# Altium footprint library misc.PcbLib: 60 footprints (part 3 of 4)
Each footprint in its own frame and in the unit in brackets; x right, y up, seen from the top. Pads: shape width x height; smd on the part's side, far side on the other; paste and mask are expansions set on the pad; w line width, h text height; cw(c..) or ccw(c..) is an arc to the next point about the centre after c.
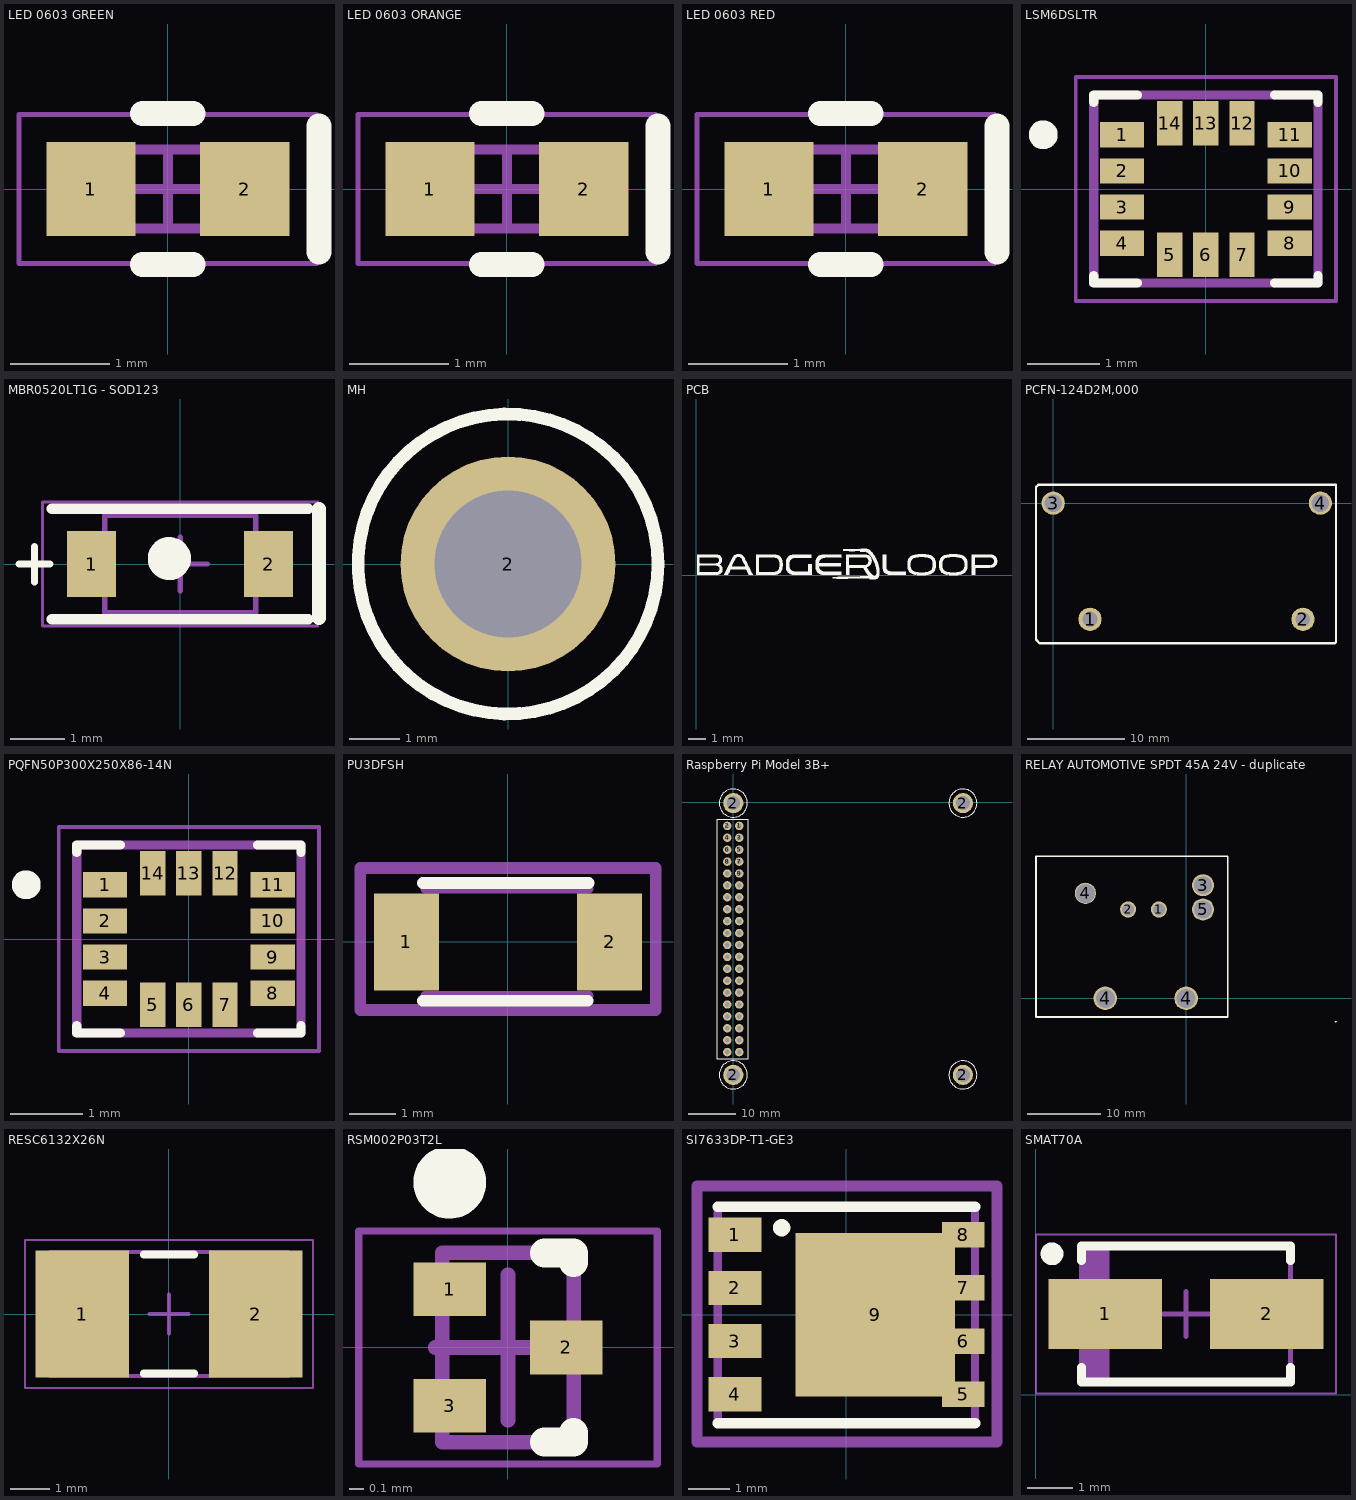
[diagram p2: the footprints below, top view; thin cyan lines are the x and y axes]

## LED 0603 GREEN [mm] "Chip Diode, 2-Leads, Body 1.60x0.80mm, IPC Medium Density"
height 0.8
pads (2):
  rect 0.9x0.95 smd: 1(-0.775,0) 2(0.775,0)
Top Overlay:
  lines w0.254: -0.254,-0.762 0.254,-0.762 ; -0.254,0.762 0.254,0.762 ; 1.524,-0.635 1.524,0.635
Mechanical 13:
  lines w0.1: -0.8,-0.4 -0.8,0.4 0.8,0.4 0.8,-0.4 -0.8,-0.4
Mechanical 15:
  lines w0.05: -1.5,-0.75 -1.5,0.75 1.5,0.75 1.5,-0.75 -1.5,-0.75
  lines w0.1: -0.4,0 0.4,0 ; 0,-0.4 0,0.4
3D body: height 0.8, standoff 0, extent -0.4,-0.4 0.4,0.4
3D body: height 0.8, standoff 0, extent -0.8,-0.4 -0.4,0.4
3D body: height 0.8, standoff 0, extent 0.4,-0.4 0.8,0.4

## LED 0603 ORANGE [mm] "Chip Diode, 2-Leads, Body 1.60x0.80mm"
height 0.75
pads (2):
  rect 0.9x0.95 smd: 1(-0.775,0) 2(0.775,0)
Top Overlay:
  lines w0.254: -0.254,-0.762 0.254,-0.762 ; -0.254,0.762 0.254,0.762 ; 1.524,-0.635 1.524,0.635
Mechanical 13:
  lines w0.1: -0.8,-0.4 0.8,-0.4 0.8,0.4 -0.8,0.4 -0.8,-0.4
Mechanical 15:
  lines w0.05: -1.5,-0.75 1.5,-0.75 1.5,0.75 -1.5,0.75 -1.5,-0.75
  lines w0.1: -0.4,0 0.4,0 ; 0,-0.4 0,0.4
3D body: height 0.8, standoff 0, extent 0.4,-0.4 0.8,0.4
3D body: height 0.8, standoff 0, extent -0.8,-0.4 -0.4,0.4
3D body: height 0.8, standoff 0, extent -0.4,-0.4 0.4,0.4

## LED 0603 RED [mm] "Chip Diode, 2-Leads, Body 1.60x0.80mm, IPC Medium Density"
height 0.8
pads (2):
  rect 0.9x0.95 smd: 1(-0.775,0) 2(0.775,0)
Top Overlay:
  lines w0.254: -0.254,-0.762 0.254,-0.762 ; -0.254,0.762 0.254,0.762 ; 1.524,-0.635 1.524,0.635
Mechanical 13:
  lines w0.1: -0.8,-0.4 0.8,-0.4 0.8,0.4 -0.8,0.4 -0.8,-0.4
Mechanical 15:
  lines w0.05: -1.5,-0.75 1.5,-0.75 1.5,0.75 -1.5,0.75 -1.5,-0.75
  lines w0.1: -0.4,0 0.4,0 ; 0,-0.4 0,0.4
3D body: height 0.8, standoff 0, extent 0.4,-0.4 0.8,0.4
3D body: height 0.8, standoff 0, extent -0.8,-0.4 -0.4,0.4
3D body: height 0.8, standoff 0, extent -0.4,-0.4 0.4,0.4

## LSM6DSLTR [mm]
height 0.86
pads (14):
  rect 0.61x0.35 smd: 1(-1.16,0.75) 2(-1.16,0.25) 3(-1.16,-0.25) 4(-1.16,-0.75) 8(1.16,-0.75) 9(1.16,-0.25) 10(1.16,0.25) 11(1.16,0.75)
  rect 0.35x0.61 smd: 5(-0.5,-0.91) 6(0,-0.91) 7(0.5,-0.91) 12(0.5,0.91) 13(0,0.91) 14(-0.5,0.91)
Top Overlay:
  circle w0.2: c-2.25,0.75 r0.1
  lines w0.127: -1.55,-1.2 -1.55,-1.3 -0.95,-1.3 ; -1.55,1.2 -1.55,1.3 -0.95,1.3 ; 0.95,-1.3 1.55,-1.3 1.55,-1.2 ; 0.95,1.3 1.55,1.3 1.55,1.2
Mechanical 13:
  lines w0.127: -1.55,-1.3 -1.55,1.3 1.55,1.3 1.55,-1.3 -1.55,-1.3
Mechanical 15:
  lines w0.05: -1.8,-1.55 -1.8,1.55 1.8,1.55 1.8,-1.55 -1.8,-1.55
3D body "LSM6DSLTR.STEP": height 0.86, standoff 0, extent -1.5,-1.25 1.5,1.25

## MBR0520LT1G - SOD123 [mm] "TSSOP, 2-Leads, Body 1.60x2.69mm, Pitch 0.00mm, IPC Medium Density"
height 0.94
pads (2):
  rect 0.91x1.22 smd: 1(-1.64,0) 2(1.64,0)
Top Overlay:
  circle w0.4: c-0.2,0.1 r0.2
  lines w0.127: -2.987,0 -2.412,0 -2.7,0 ; -2.7,-0.337 -2.7,0.325
  lines w0.2: -2.375,-1.025 2.375,-1.025 ; -2.375,1.025 2.375,1.025
  lines w0.254: 2.575,-1 2.575,1.025
Top Assembly:
  lines w0.1: -1.4,-0.9 -1.4,0.9 1.4,0.9 1.4,-0.9 -1.4,-0.9
Mechanical 15:
  lines w0.05: -2.55,-1.15 2.55,-1.15 2.55,1.15 -2.55,1.15 -2.55,-1.15
  lines w0.1: -0.5,0 0.5,0 ; 0,-0.5 0,0.5
3D body: height 1.04, standoff 0, extent -1.35,-0.85 1.35,0.85

## MH [mm] "#10 Mount Hole"
pads (1):
  round 4.3 hole 2.946 unplated: 2(0,0)
Top Overlay:
  circle w0.254: c0,0 r3
3D body "4_40_Screw.stp": height 2.84, standoff -6.35, extent -2.324,-2.578 2.324,2.07

## PCB [mm]
Top Overlay:
  drawing of 10 lines, arcs and shapes, not listed
  text ".Pcb_File_Name_No_Path" at 0.05,-2.794 h1.52
  text ".Revision" at 10.16,-2.794 h1.52
  text ".Designer" at 10.16,-5.063 h1.52
  text ".Engineer" at 0.05,-5.08 h1.52

## PCFN-124D2M,000 [mm]
pads (4):
  round 2.4 hole 1.6: 1(3.8,-12)
  round 2.4 hole 1.5: 2(25.8,-12)
  round 2.4 hole 1.8: 3(0,0) 4(27.6,0)
Top Overlay:
  lines w0.254: -1.778,-14.097 -1.778,1.651 -1.524,1.905 28.956,1.905 29.21,1.905 29.21,-14.351 29.083,-14.478 -1.397,-14.478 -1.778,-14.097
3D body "c-1461193-9-c-3d.stp": height 29, standoff -2.5, extent -1.484,-14.223 28.916,1.777

## PQFN50P300X250X86-14N [mm]
pads (14):
  rect 0.61x0.35 smd: 1(-1.16,0.75) 2(-1.16,0.25) 3(-1.16,-0.25) 4(-1.16,-0.75) 8(1.16,-0.75) 9(1.16,-0.25) 10(1.16,0.25) 11(1.16,0.75)
  rect 0.35x0.61 smd: 5(-0.5,-0.91) 6(0,-0.91) 7(0.5,-0.91) 12(0.5,0.91) 13(0,0.91) 14(-0.5,0.91)
Top Overlay:
  circle w0.2: c-2.25,0.75 r0.1
  lines w0.127: -1.55,-1.2 -1.55,-1.3 -0.95,-1.3 ; -1.55,1.2 -1.55,1.3 -0.95,1.3 ; 0.95,-1.3 1.55,-1.3 1.55,-1.2 ; 0.95,1.3 1.55,1.3 1.55,1.2
Mechanical 13:
  lines w0.127: -1.55,-1.3 1.55,-1.3 1.55,1.3 -1.55,1.3 -1.55,-1.3
Mechanical 15:
  lines w0.05: -1.8,-1.55 1.8,-1.55 1.8,1.55 -1.8,1.55 -1.8,-1.55
3D body "step_temp.STEP": height 0.86, standoff 0, extent -1.5,-1.25 1.5,1.25

## PU3DFSH [mm]
pads (2):
  rect 1.4x2.1 smd: 1(-2.2,0) 2(2.2,0)
Top Overlay:
  lines w0.254: -1.85,-1.275 1.725,-1.275 ; -1.85,1.275 1.75,1.275
Top Assembly:
  lines w0.2: -1.8,1.15 1.75,1.15 ; -1.797,-1.165 1.753,-1.165
Top Courtyard:
  lines w0.254: -3.2,-1.475 -3.2,0 -3.2,1.6 3.2,1.6 3.2,-1.475 -3.2,-1.475
3D body: height 0.9, standoff 0.05, extent -1.975,-1.15 1.875,1.15

## Raspberry Pi Model 3B+ [mil]
pads (44):
  round 70.8 hole 40: 1(50,-197.73) 2(-50,-197.73) 3(50,-297.73) 4(-50,-297.73) 5(50,-397.73) 6(-50,-397.73) 7(50,-497.73) 8(-50,-497.73) 9(50,-597.73) 10(-50,-597.73) 11(50,-697.73) 12(-50,-697.73) 13(50,-797.73) 14(-50,-797.73) 15(50,-897.73) 16(-50,-897.73) 17(50,-997.73) 18(-50,-997.73) 19(50,-1097.73) 20(-50,-1097.73) 21(50,-1197.73) 22(-50,-1197.73) 23(50,-1297.73) 24(-50,-1297.73) 25(50,-1397.73) 26(-50,-1397.73) 27(50,-1497.73) 28(-50,-1497.73) 29(50,-1597.73) 30(-50,-1597.73) 31(50,-1697.73) 32(-50,-1697.73) 33(50,-1797.73) 34(-50,-1797.73) 35(50,-1897.73) 36(-50,-1897.73) 37(50,-1997.73) 38(-50,-1997.73) 39(50,-2097.73) 40(-50,-2097.73)
  round 169.29 hole 116 unplated: 2(0,-2289.46) 2(0,-6) 2(1929.13,-2289.46) 2(1929.13,-6)
Top Overlay:
  circle w10: c1929.13,-2289.46 r118.11
  circle w10: c0,-2289.46 r118.11
  circle w10: c1929.13,-6 r118.11
  circle w10: c0,-6 r118.11
  lines w10: -136.81,-2154.53 125,-2154.53 125,-143.7 -136.81,-143.7 -136.81,-2154.53
3D body "raspberry_pi_3_b_plus.stp": height 493.65, standoff -294.72, extent -146.5,-3303.94 2155,131.94

## RELAY AUTOMOTIVE SPDT 45A 24V - duplicate [mm]
pads (7):
  round 2.2 hole 1.6: 1(-3.7,12.1) 2(-7.9,12.1)
  round 3 hole 2.4: 3(2.3,15.4) 5(2.3,12.1)
  round 2.896 hole 2.591: 4(-13.7,14.3)
  round 3.2 hole 2.591: 4(-11,0) 4(0,0)
Top Overlay:
  lines w0.254: 5.588,-2.54 -20.432,-2.54 -20.432,19.335 5.668,19.335 5.668,-2.54 ; 20.4,-3.175 20.32,-3.175 ; 20.32,-3.175 20.32,-3.175
3D body "1-1393277-8.stp": height 24.2, standoff 0, extent -20.385,-2.168 5.715,18.932

## RESC6132X26N [mm] "Chip Resistor, 2-Leads, Body 6.10x3.18mm, IPC Medium Density"
height 2.57
pads (2):
  rect 2.4x3.25 smd: 1(-2.225,0) 2(2.225,0)
Top Overlay:
  lines w0.2: -0.65,-1.525 0.65,-1.525 ; -0.65,1.525 0.65,1.525
Mechanical 13:
  lines w0.1: -3.05,-1.59 -3.05,1.59 3.05,1.59 3.05,-1.59 -3.05,-1.59
Mechanical 15:
  lines w0.05: -3.7,-1.9 -3.7,1.9 3.7,1.9 3.7,-1.9 -3.7,-1.9
  lines w0.1: -0.5,0 0.5,0 ; 0,-0.5 0,0.5
3D body: height 2.57, standoff 0, extent -1.05,-1.59 1.05,1.59
3D body: height 2.57, standoff 0, extent -3.05,-1.59 -1.05,1.59
3D body: height 2.57, standoff 0, extent 1.05,-1.59 3.05,1.59

## RSM002P03T2L [mm]
height 0.55
pads (3):
  rect 0.5x0.37 smd: 1(-0.4,0.4) 2(0.4,0) 3(-0.4,-0.4)
Top Overlay:
  circle w0.25: c-0.4,1.135 r0.125
  lines w0.2: 0.25,-0.65 0.45,-0.65 0.45,-0.585 ; 0.25,0.65 0.45,0.65 0.45,0.585
Top Assembly:
  lines w0.1: -0.45,-0.65 -0.45,0.65 0.45,0.65 0.45,-0.65 -0.45,-0.65
Mechanical 15:
  lines w0.05: -1.025,-0.8 1.025,-0.8 1.025,0.8 -1.025,0.8 -1.025,-0.8
  lines w0.1: -0.5,0 0.5,0 ; 0,-0.5 0,0.5
3D body "RSM002P03T2L.step": height 0.55, standoff 0, extent -0.6,-0.648 0.6,0.648

## SI7633DP-T1-GE3 [mm]
pads (9):
  rect 1.27x0.82 smd: 1(-2.67,1.905) 2(-2.67,0.635) 3(-2.67,-0.635) 4(-2.67,-1.905)
  rect 1.02x0.61 smd: 5(2.795,-1.905) 6(2.795,-0.635) 7(2.795,0.635) 8(2.795,1.905)
  rect 3.81x3.91 smd: 9(0.69,0)
Top Overlay:
  circle w0.254: c-1.55,2.075 r0.079
  lines w0.254: -3.075,-2.6 3.075,-2.6 ; -3.075,2.575 3.075,2.575
Top Assembly:
  lines w0.2: -3.075,-2.575 -3.075,2.575 3.075,2.575 3.075,-2.575 -3.075,-2.575
Top Courtyard:
  lines w0.254: -3.575,-3.05 -3.575,3.075 3.6,3.075 3.6,-3.05 -3.575,-3.05
3D body "User Library-PowerPAK SO-8 (S).step": height 1.04, standoff 0, extent -3.075,-2.575 3.075,2.575

## SMAT70A [mm]
pads (2):
  rect 2.5x1.55 smd: 1(1.524,1.778) 2(5.08,1.778)
Top Overlay:
  circle w0.25: c0.352,3.103 r0.125
  lines w0.2: 1.002,0.603 1.002,0.278 5.602,0.278 5.602,0.603 ; 1.002,2.953 1.002,3.278 5.602,3.278 5.602,2.953
Mechanical 13:
  rectangle: 1.002,0.318 1.621,3.238
  lines w0.1: 1.002,0.318 5.602,0.318 5.602,3.238 1.002,3.238 1.002,0.318
Mechanical 15:
  lines w0.05: 0,0.028 6.604,0.028 6.604,3.528 0,3.528 0,0.028
  lines w0.1: 2.802,1.778 3.802,1.778 ; 3.302,1.278 3.302,2.278
3D body "DIOM4326X23N.step": height 2.3, standoff 0, extent 0.782,0.318 5.822,3.238